# Altium footprint library Item_pcb.PcbLib: 282 footprints (part 4 of 18)
Each footprint in its own frame and in the unit in brackets; x right, y up, seen from the top. Pads: shape width x height; smd on the part's side, far side on the other; paste and mask are expansions set on the pad; w line width, h text height; cw(c..) or ccw(c..) is an arc to the next point about the centre after c.
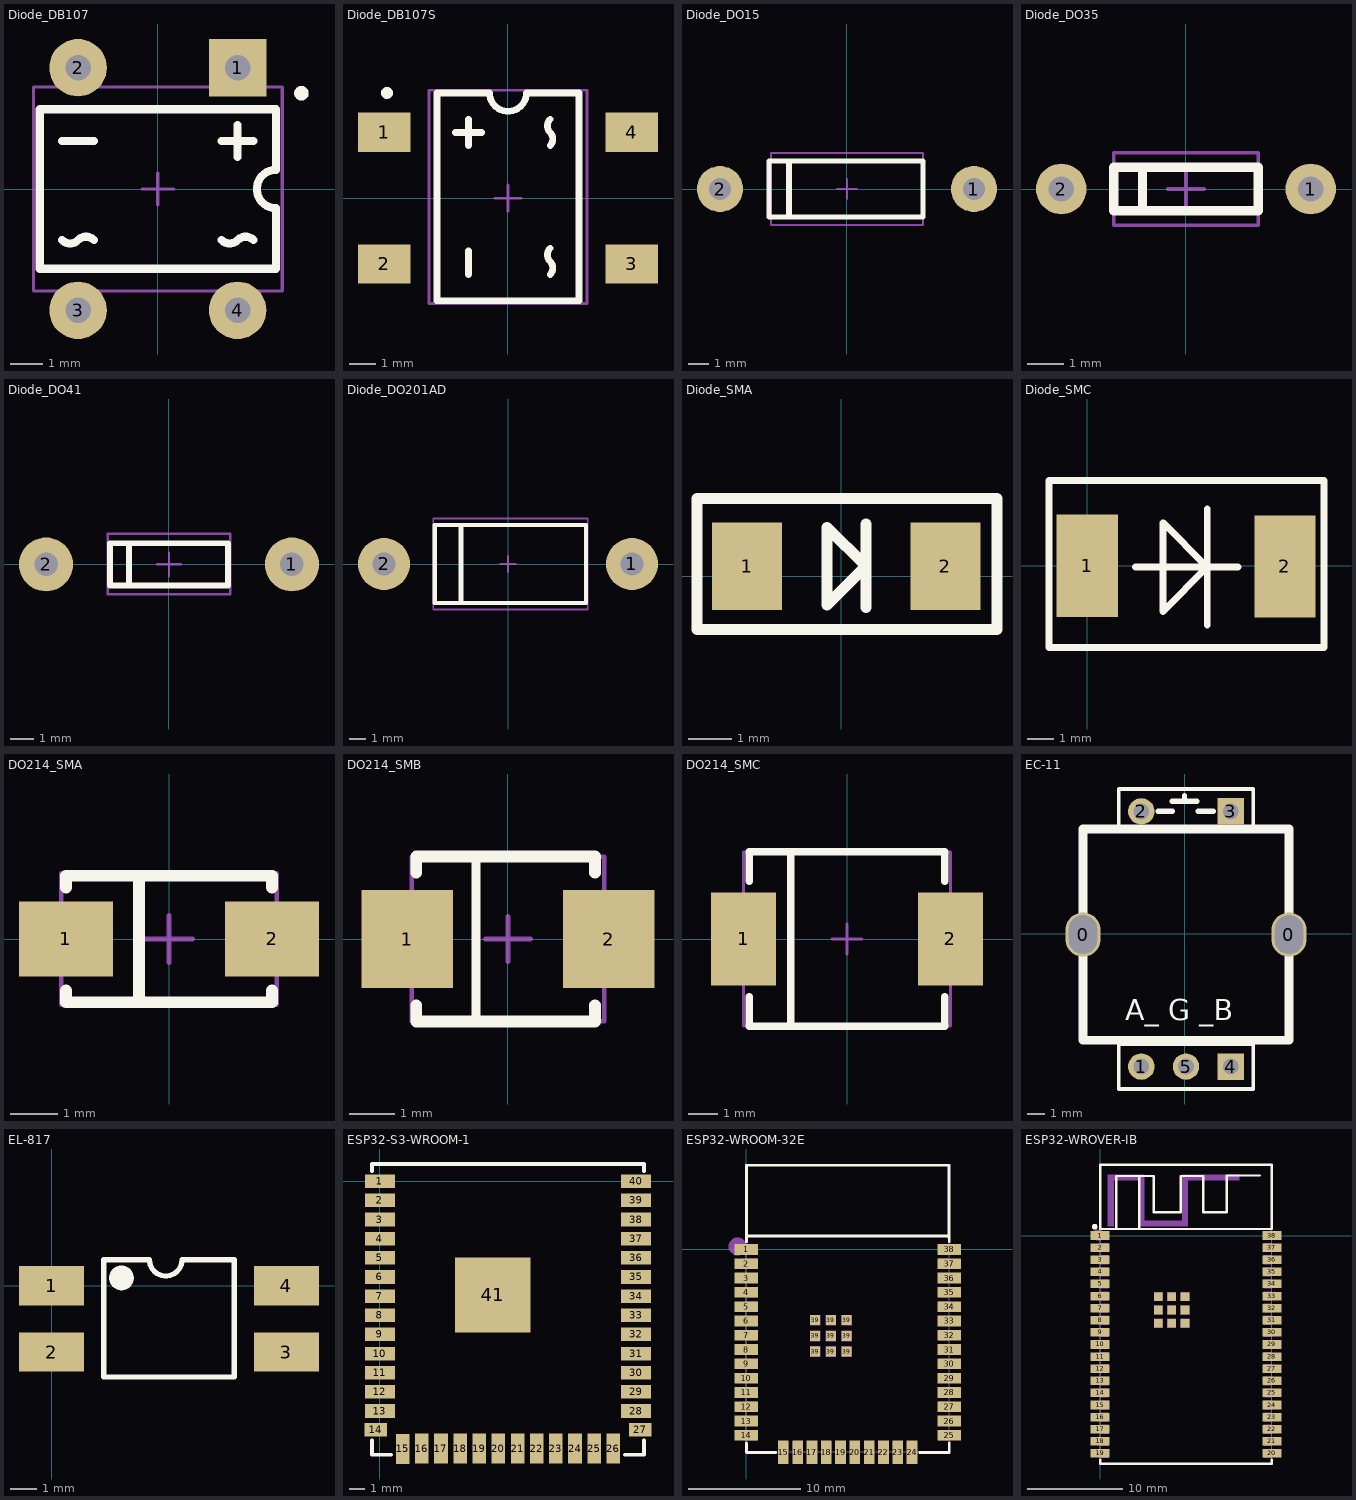
[diagram p3: the footprints below, top view; thin cyan lines are the x and y axes]

## Diode_DB107 [mm]
pads (4):
  rect 1.8x1.8 hole 0.8: 1(2.5,3.8)
  round 1.8 hole 0.8: 2(-2.5,3.8) 3(-2.5,-3.8) 4(2.5,-3.8)
Top Overlay:
  circle w0.254: c4.5,3 r0.1
  lines w0.254: -3,-1.6 ccw(c-2.75,-1.35) -2.5,-1.6 cw(c-2.25,-1.85) -2,-1.6 ; -3,1.5 -2,1.5 ; 2,-1.6 ccw(c2.25,-1.35) 2.5,-1.6 cw(c2.75,-1.85) 3,-1.6 ; 2,1.5 3,1.5 ; 2.5,1 2.5,2 ; -3.7,-2.5 -3.7,2.5 3.7,2.5 3.7,0.6 ccw(c3.7,0) 3.7,-0.6 3.7,-2.5 -3.7,-2.5
Mechanical 15:
  lines w0.1: -0.5,0 0.5,0 ; 0,-0.5 0,0.5 ; -3.9,-3.2 -3.9,3.2 3.9,3.2 3.9,-3.2 -3.9,-3.2
3D body "DB107.STEP": height 3.8, standoff -2.7, extent -3.85,-3.983 3.85,4

## Diode_DB107S [mm]
pads (4):
  rect 2x1.5 smd: 1(-4.7,2.5) 2(-4.7,-2.5) 3(4.7,-2.5) 4(4.7,2.5)
Top Overlay:
  circle w0.254: c-4.6,4 r0.1
  lines w0.254: -2,2.5 -1,2.5 ; -1.5,-2.9 -1.5,-2 ; -1.5,2 -1.5,3 ; 1.6,-2.9 ccw(c1.35,-2.65) 1.6,-2.4 cw(c1.85,-2.15) 1.6,-1.9 ; 1.6,2 ccw(c1.35,2.25) 1.6,2.5 cw(c1.85,2.75) 1.6,3 ; -2.7,-3.9 2.7,-3.9 2.7,4 0.7,4 cw(c0,4) -0.7,4 -2.7,4 -2.7,-3.9
Mechanical 15:
  lines w0.1: -0.5,0 0.5,0 ; 0,-0.5 0,0.5 ; -3,-4 -3,4.1 3,4.1 3,-4 -3,-4
3D body "DB107S.STEP": height 2.7, standoff 0, extent -5.075,-4 5.075,4.1

## Diode_DO15 [mm]
pads (2):
  round 2.3 hole 1.1: 1(6.35,0) 2(-6.35,0)
Top Overlay:
  lines w0.254: -3.9,-1.4 -3.9,1.4 3.8,1.4 3.8,-1.4 -3.9,-1.4
  lines w0.3: -2.9,-1.3 -2.9,1.3
Mechanical 15:
  lines w0.1: -0.5,0 0.5,0 ; 0,-0.5 0,0.5 ; -3.8,-1.8 3.8,-1.8 3.8,1.8 -3.8,1.8 -3.8,-1.8
3D body "DO-15-12.7.STEP": height 3.58, standoff -3.2, extent -6.73,-1.76 6.83,1.8

## Diode_DO35 [mm]
pads (2):
  round 1.4 hole 0.7: 1(3.45,0) 2(-3.45,0)
Top Overlay:
  lines w0.254: -1.2,-0.6 -1.2,0.6 ; -2,-0.6 2,-0.6 2,0.6 -2,0.6 -2,-0.6
Mechanical 15:
  lines w0.1: -0.5,0 0.5,0 ; 0,-0.5 0,0.5 ; -2,-1 -2,1 2,1 2,-1 -2,-1
3D body "DIO(IN4148).STEP": height 2.3, standoff -4.2, extent -3.75,-1 3.75,1

## Diode_DO41 [mm]
pads (2):
  round 2.3 hole 1: 1(5.23,0) 2(-5.23,0)
Top Overlay:
  lines w0.254: -1.7,-0.9 -1.7,0.9 ; -2.5,-0.9 2.5,-0.9 2.5,0.9 -2.5,0.9 -2.5,-0.9
Mechanical 15:
  lines w0.1: -0.5,0 0.5,0 ; 0,-0.5 0,0.5 ; -2.6,-1.265 -2.6,1.3 2.6,1.3 2.6,-1.265 -2.6,-1.265
3D body "DIO(1N4007).STEP": height 2.55, standoff -2.54, extent -5.461,-1.265 5.461,1.3

## Diode_DO201AD [mm]
pads (2):
  round 3.2 hole 1.4: 1(7.62,0) 2(-7.62,0)
Top Overlay:
  lines w0.254: -4.5,-2.4 4.8,-2.4 4.8,2.4 -4.5,2.4 -4.5,-2.4
  lines w0.3: -2.9,-2.3 -2.9,2.3
Mechanical 15:
  lines w0.1: -0.5,0 0.5,0 ; 0,-0.5 0,0.5 ; -4.6,-2.8 -4.6,2.8 4.9,2.8 4.9,-2.8 -4.6,-2.8
3D body "DO-201AD.STEP": height 5.6, standoff -6, extent -8.28,-2.8 8.28,2.8

## Diode_SMA [mil] "SMA"
pads (2):
  rect 63x78.74 smd: 1(-85,9) 2(93.56,9)
Top Overlay:
  lines w10: 22,-28 22,47 ; -130,-48 -130,70 140,70 140,-48 -130,-48 ; -13,-26 -13,44 22,9 -13,-26
3D body "DO-214AC.STEP": height 94.49, standoff 0, extent -84.55,-43.15 96.55,63.15

## Diode_SMC [mil] "DO-214AB(2114)"
pads (2):
  rect 90x149.84 smd: 1(0,0)
  rect 90x149.63 smd: 2(290,-1)
Top Overlay:
  lines w10: 71,-2 221,-2 ; 176,-87 176,83 ; -56,-120 -56,125 347,125 347,-120 -56,-120 ; 111,-67 176,-2 111,63 111,-67
3D body "DO-214AB.STEP": height 106.3, standoff 0, extent -14.84,-117.09 304.84,127

## DO214_SMA [mm]
pads (2):
  rect 2x1.6 smd: 1(-2.2,0) 2(2.2,0)
Top Overlay:
  lines w0.254: -2.2,-1.1 -2.2,-1.35 2.2,-1.35 2.2,-1.1 ; -2.2,1.1 -2.2,1.35 2.2,1.35 2.2,1.1 ; -0.636,-1.35 -0.636,1.35
Mechanical 15:
  lines w0.1: -0.5,0 0.5,0 ; 0,-0.5 0,0.5 ; -2.3,-1.4 2.3,-1.4 2.3,1.4 -2.3,1.4 -2.3,-1.4
3D body "DO214 SMA.STEP": height 2.32, standoff 0.04, extent -2.686,-1.4 2.8,1.394

## DO214_SMB [mm]
pads (2):
  rect 2x2.15 smd: 1(-2.2,0) 2(2.2,0)
Top Overlay:
  lines w0.2: -0.7,-1.8 -0.7,1.8
  lines w0.254: -2,-1.45 -2,-1.8 1.9,-1.8 1.9,-1.45 ; -2,1.45 -2,1.8 1.9,1.8 1.9,1.45
Mechanical 15:
  lines w0.1: -0.5,0 0.5,0 ; 0,-0.5 0,0.5 ; -2.1,-1.8 2.1,-1.8 2.1,1.8 -2.1,1.8 -2.1,-1.8
3D body "DO214 SMB.STEP": height 2.3, standoff 0, extent -2.7,-1.8 2.7,1.8

## DO214_SMC [mm]
pads (2):
  rect 2.2x3.15 smd: 1(-3.5,0) 2(3.5,0)
Top Overlay:
  lines w0.254: -3.3,-1.95 -3.3,-2.95 3.3,-2.95 3.3,-1.95 ; -3.3,1.95 -3.3,2.95 3.3,2.95 3.3,1.95 ; -1.9,-2.95 -1.9,2.95
Mechanical 15:
  lines w0.1: -0.5,0 0.5,0 ; 0,-0.5 0,0.5 ; -3.5,-2.95 -3.5,2.95 3.5,2.95 3.5,-2.95 -3.5,-2.95
3D body "DO214 SMC.STEP": height 2.3, standoff 0, extent -4,-2.95 3.95,2.95

## EC-11 [mm]
pads (7):
  oval 2x2.5 hole 2.2 slot 1.6 at 0 deg: 0(-5.782,-0.051) 0(5.918,-0.051)
  round 1.5 hole 0.9: 1(-2.472,-7.551) 2(-2.472,6.949) 5(0.068,-7.551)
  rect 1.5x1.5 hole 0.9: 3(2.608,6.949) 4(2.608,-7.551)
Top Overlay:
  lines w0.2: -3.742,5.949 -3.742,8.219 3.878,8.219 3.878,5.949 ; -3.742,-8.821 3.878,-8.821 3.878,-6.281 -3.742,-6.281 -3.742,-8.821
  lines w0.305: -1.499,6.949 -0.711,6.949 ; -0.711,7.518 0.675,7.518 ; -0.018,7.518 -0.018,7.841 ; 0.752,6.949 1.626,6.949
  lines w0.508: -5.782,-6.051 -5.782,5.949 5.918,5.949 5.918,-6.051 -5.782,-6.051
  text "A_ G _B" at -3.378,-5.315 h2.03
3D body "EC12E-bushing-20.STEP": height 20.05, standoff -3.5, extent -6.919,-7.747 7.072,6.503

## EL-817 [mm]
pads (4):
  rect 2.5x1.5 smd: 1(0,0) 2(0,-2.54) 3(9,-2.54) 4(9,0)
Top Overlay:
  circle w0.5: c2.676,0.3 r0.224
  lines w0.2: 3.7,1 2,1 2,-3.5 7,-3.5 7,1 5,1 cw(c4.375,1) 3.75,1
3D body "User Library-4-SMD.STEP": height 3.75, standoff -0.01, extent -0.52,-3.569 9.64,1.029

## ESP32-S3-WROOM-1 [mm]
pads (41):
  rect 2x0.9 smd: 1(0,0) 2(0,-1.27) 3(0,-2.54) 4(0,-3.81) 5(0,-5.08) 6(0,-6.35) 7(0,-7.62) 8(0,-8.89) 9(0,-10.16) 10(0,-11.43) 11(0,-12.7) 12(0,-13.97) 13(0,-15.24) 28(17,-15.24) 29(17,-13.97) 30(17,-12.7) 31(17,-11.43) 32(17,-10.16) 33(17,-8.89) 34(17,-7.62) 35(17,-6.35) 36(17,-5.08) 37(17,-3.81) 38(17,-2.54) 39(17,-1.27) 40(17,0)
  rect 1.5x0.9 smd: 14(-0.263,-16.485) 27(17.263,-16.485)
  rect 0.9x2 smd: 15(1.515,-17.755) 16(2.785,-17.73) 17(4.055,-17.73) 18(5.325,-17.73) 19(6.595,-17.73) 20(7.865,-17.73) 21(9.135,-17.73) 22(10.405,-17.73) 23(11.675,-17.73) 24(12.945,-17.73) 25(14.215,-17.73) 26(15.485,-17.73)
  rect 5x5 smd: 41(7.483,-7.543)
Top Overlay:
  lines w0.254: -0.517,-17.191 -0.517,-18.136 0.753,-18.136 ; -0.517,0.681 -0.517,1.143 17.517,1.143 17.517,0.681 ; 16.247,-18.136 17.517,-18.136 17.517,-17.191
3D body "ESP32-S3-WROOM.step": height 3.11, standoff -0.05, extent -0.517,-18.136 17.503,7.374

## ESP32-WROOM-32E [mm] "4MB"
pads (47):
  rect 2.1x0.95 smd: 1(0,0) 2(0,-1.27) 3(0,-2.54) 4(0,-3.81) 5(0,-5.08) 6(0,-6.35) 7(0,-7.62) 8(0,-8.89) 9(0,-10.16) 10(0,-11.43) 11(0,-12.7) 12(0,-13.97) 13(0,-15.24) 14(0,-16.51) 25(18,-16.51) 26(18,-15.24) 27(18,-13.97) 28(18,-12.7) 29(18,-11.43) 30(18,-10.16) 31(18,-8.89) 32(18,-7.62) 33(18,-6.35) 34(18,-5.08) 35(18,-3.81) 36(18,-2.54) 37(18,-1.27) 38(18,0)
  rect 0.95x2.1 smd: 15(3.285,-18.005) 16(4.555,-18.005) 17(5.825,-18.005) 18(7.095,-18.005) 19(8.365,-18.005) 20(9.635,-18.005) 21(10.905,-18.005) 22(12.175,-18.005) 23(13.445,-18.005) 24(14.715,-18.005)
  rect 0.9x0.9 smd: 39(6.1,-9.081) 39(6.1,-7.681) 39(6.1,-6.281) 39(7.5,-7.681) 39(7.5,-9.081) 39(7.5,-6.281) 39(8.9,-9.081) 39(8.9,-7.681) 39(8.9,-6.281)
Top Overlay:
  lines w0.254: 0,-17.191 0,-18.026 2.604,-18.026 ; 0,0.681 0,1.19 18,1.19 ; 0,1.024 0,7.474 18,7.474 18,1.008 ; 15.396,-18.026 18.017,-18.026 18.017,-17.191 ; 18.017,0.681 18.017,1.19
Mechanical 6:
  circle w0.8: c-0.779,0.262 r0.4
Mechanical 15:
  drawing of 52 lines, arcs and shapes, not listed
3D body "3D_PCB2_2024-03-27-ESP32_end.STEP": height 3.4, standoff 0.2, extent 0.034,-17.982 18.034,1.218

## ESP32-WROVER-IB [mm] "18*31.4*3.3"
pads (47):
  rect 2x0.9 smd: 1(0,0) 2(0,-1.27) 3(0,-2.54) 4(0,-3.81) 5(0,-5.08) 6(0,-6.35) 7(0,-7.62) 8(0,-8.89) 9(0,-10.16) 10(0,-11.43) 11(0,-12.7) 12(0,-13.97) 13(0,-15.24) 14(0,-16.51) 15(0,-17.78) 16(0,-19.05) 17(0,-20.32) 18(0,-21.59) 19(0,-22.86) 20(18,-22.86) 21(18,-21.59) 22(18,-20.32) 23(18,-19.05) 24(18,-17.78) 25(18,-16.51) 26(18,-15.24) 27(18,-13.97) 28(18,-12.7) 29(18,-11.43) 30(18,-10.16) 31(18,-8.89) 32(18,-7.62) 33(18,-6.35) 34(18,-5.08) 35(18,-3.81) 36(18,-2.54) 37(18,-1.27) 38(18,0)
  rect 0.9x0.9 smd: 39(6.105,-9.205) 39(6.105,-7.81) 39(6.105,-6.415) 39(7.5,-6.415) 39(7.5,-9.205) 39(7.5,-7.81) 39(8.895,-9.205) 39(8.895,-7.81) 39(8.895,-6.415)
Top Overlay:
  circle w0.3: c-0.57,0.92 r0.15
  lines w0.254: -0.001,-23.542 -0.001,-23.961 0.009,-23.961 18,-23.961 18,-23.542 ; 1.696,0.682 1.696,6.24 5.63,6.24 5.63,2.44 8.45,2.44 8.45,6.24 10.83,6.24 10.83,2.44 13.289,2.44 13.289,6.29 16.751,6.29 ; 4.099,0.681 4.099,6.24 4.442,6.24 ; 17.99,7.44 0,7.44 0,0.681 18,0.681 18,7.44
Mechanical 6:
  circle w0.6: c-0.2,0.05 r0.3
  region: 9.2,6.37 14.6,6.37 14.6,5.77 9.2,5.77
  region: 8.6,0.97 8.6,6.37 9.2,6.37 9.2,0.97
  region: 4.6,0.97 8.6,0.97 8.6,1.57 4.6,1.57
  region: 4,6.37 4.6,6.37 4.6,0.97 4,0.97
  region: 1.4,6.37 4,6.37 4,5.77 1.4,5.77
  region: 0.8,0.97 0.8,6.37 1.4,6.37 1.4,0.97
Mechanical 15:
  drawing of 52 lines, arcs and shapes, not listed